# Altium footprint library ICL_modules_v1.PcbLib: 24 footprints (part 2 of 2)
Each footprint in its own frame and in the unit in brackets; x right, y up, seen from the top. Pads: shape width x height; smd on the part's side, far side on the other; paste and mask are expansions set on the pad; w line width, h text height; cw(c..) or ccw(c..) is an arc to the next point about the centre after c.
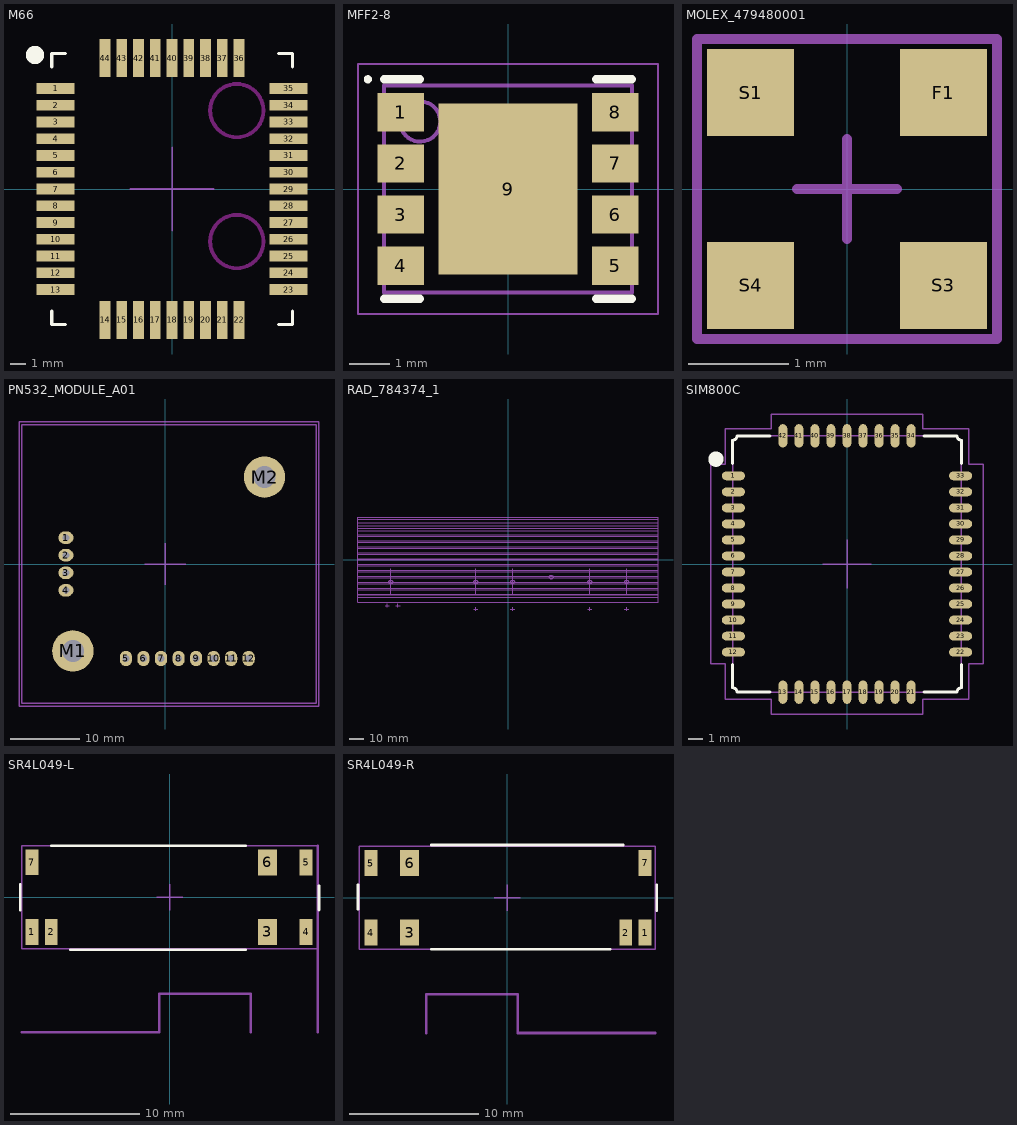
[diagram p1: the footprints below, top view; thin cyan lines are the x and y axes]

## M66 [mm]
pads (44):
  rect 2.5x0.7 smd mask+0.1: 1(-7.65,6.6) 2(-7.65,5.5) 3(-7.65,4.4) 4(-7.65,3.3) 5(-7.65,2.2) 6(-7.65,1.1) 7(-7.65,0) 8(-7.65,-1.1) 9(-7.65,-2.2) 10(-7.65,-3.3) 11(-7.65,-4.4) 12(-7.65,-5.5) 13(-7.65,-6.6) 23(7.65,-6.6) 24(7.65,-5.5) 25(7.65,-4.4) 26(7.65,-3.3) 27(7.65,-2.2) 28(7.65,-1.1) 29(7.65,0) 30(7.65,1.1) 31(7.65,2.2) 32(7.65,3.3) 33(7.65,4.4) 34(7.65,5.5) 35(7.65,6.6)
  rect 0.7x2.5 smd mask+0.1: 14(-4.4,-8.6) 15(-3.3,-8.6) 16(-2.2,-8.6) 17(-1.1,-8.6) 18(0,-8.6) 19(1.1,-8.6) 20(2.2,-8.6) 21(3.3,-8.6) 22(4.4,-8.6) 36(4.4,8.6) 37(3.3,8.6) 38(2.2,8.6) 39(1.1,8.6) 40(0,8.6) 41(-1.1,8.6) 42(-2.2,8.6) 43(-3.3,8.6) 44(-4.4,8.6)
Top Layer keep-out:
  circle w0.254: c4.25,5.15 r1.75
  circle w0.254: c4.25,-3.45 r1.75
Top Overlay:
  circle w0.6: c-9,8.8 r0.3
  lines w0.2: -7.9,-8 -7.9,-8.9 -7,-8.9 ; -7.9,8 -7.9,8.9 -7,8.9 ; 7,-8.9 7.9,-8.9 7.9,-8 ; 7,8.9 7.9,8.9 7.9,8
Top M15-16_SORG:
  lines w0.1: -2.75,0 0,0 ; 0,-2.75 0,0 ; 0,2.75 0,0 ; 2.75,0 0,0
3D body "m66_3d_v2.STEP": height 2.3, standoff 0, extent -7.9,-8.85 7.9,8.85

## MFF2-8 [mm] "PSON, 8-Leads, Body 5,08x6,08mm, Pitch 1,27mm, Thermal Pad 4,25x3,45mm, IPC Low Density"
height 0.9
pads (9):
  rect 1.15x0.95 smd: 1(-2.665,1.905) 2(-2.665,0.635) 3(-2.665,-0.635) 4(-2.665,-1.905) 5(2.665,-1.905) 6(2.665,-0.635) 7(2.665,0.635) 8(2.665,1.905)
  rect 3.45x4.25 smd paste-1.725: 9(0,0)
Top Overlay:
  circle w0.1: c-3.48,2.725 r0.05
  lines w0.2: -3.08,-2.725 -2.19,-2.725 ; -3.08,2.725 -2.19,2.725 ; 2.19,-2.725 3.08,-2.725 ; 2.19,2.725 3.08,2.725
Top Paste:
  rectangle: 0.675,-2.03 1.625,-0.81
  rectangle: 0.675,-0.61 1.625,0.61
  rectangle: 0.675,0.81 1.625,2.03
  rectangle: -0.475,-2.03 0.475,-0.81
  rectangle: -0.475,-0.61 0.475,0.61
  rectangle: -0.475,0.81 0.475,2.03
  rectangle: -1.625,-2.03 -0.675,-0.81
  rectangle: -1.625,-0.61 -0.675,0.61
  rectangle: -1.625,0.81 -0.675,2.03
Top M13-14_SDES:
  circle w0.1: c-2.18,1.675 r0.5
  lines w0.1: -3.08,-2.575 3.08,-2.575 3.08,2.575 -3.08,2.575 -3.08,-2.575
Top M15-16_SORG:
  lines w0.05: -3.725,-3.1 3.725,-3.1 3.725,3.1 -3.725,3.1 -3.725,-3.1
  lines w0.1: -0.5,0 0.5,0 ; 0,-0.5 0,0.5
3D body "MFF2-8.step": height 0.9, standoff 0, extent -3.081,-2.575 3.081,2.575

## MOLEX_479480001 [mm] "Antena 2,54GHz MID"
pads (4):
  rect 0.87x0.87 smd mask+0.1: F1(0.965,0.965) S1(-0.965,0.965) S3(0.965,-0.965) S4(-0.965,-0.965)
Top M15-16_SORG:
  lines w0.1: -0.5,0 0.5,0 ; 0,-0.5 0,0.5 ; -1.5,-1.5 1.5,-1.5 1.5,1.5 -1.5,1.5 -1.5,-1.5
3D body "479480001.stp": height 4, standoff 0, extent -1.57,-1.57 1.57,1.57

## PN532_MODULE_A01 [mm] "NFC module"
pads (14):
  oval 2.2x1.8 hole 1: 1(-14.4,3.81) 2(-14.4,1.27) 3(-14.4,-1.27) 4(-14.4,-3.81)
  oval 1.8x2.2 hole 1: 5(-5.69,-13.7) 6(-3.15,-13.7) 7(-0.61,-13.7) 8(1.93,-13.7) 9(4.47,-13.7) 10(7.01,-13.7) 11(9.55,-13.7) 12(12.091,-13.7)
  round 6 hole 3.2: M1(-13.4,-12.6) M2(14.4,12.6)
Top M15-16_SORG:
  lines w0.2: -3,0 0,0 ; 0,-3 0,0 ; 0,3 0,0 ; 3,0 0,0 ; -21.2,-20.6 -21.2,20.6 22.3,20.6 22.3,-20.6 -21.2,-20.6
Top M17-18_TDES:
  text "'.Designator'" at -10.83,-0.533 h2
Top M19-20_TMOT:
  lines w0.2: -20.8,-20.2 21.9,-20.2 21.9,20.2 -20.8,20.2 -20.8,-20.2
3D body "PN532_NFC_Assembly.STEP": height 11.6, standoff 0.55, extent -20.8,-20.2 21.9,20.2

## RAD_784374_1 [mm]
Top M19-20_TMOT:
  drawing of 656 lines, arcs and shapes, not listed
3D body "784374swp001.stp": height 20, standoff -0.02, extent -105,-29.75 105,29.75

## SIM800C [mm]
pads (42):
  oval 1.6x0.6 smd mask+0.1: 1(-7.8,6.05) 2(-7.8,4.95) 3(-7.8,3.85) 4(-7.8,2.75) 5(-7.8,1.65) 6(-7.8,0.55) 7(-7.8,-0.55) 8(-7.8,-1.65) 9(-7.8,-2.75) 10(-7.8,-3.85) 11(-7.8,-4.95) 12(-7.8,-6.05) 22(7.8,-6.05) 23(7.8,-4.95) 24(7.8,-3.85) 25(7.8,-2.75) 26(7.8,-1.65) 27(7.8,-0.55) 28(7.8,0.55) 29(7.8,1.65) 30(7.8,2.75) 31(7.8,3.85) 32(7.8,4.95) 33(7.8,6.05)
  oval 0.6x1.6 smd mask+0.1: 13(-4.4,-8.8) 14(-3.3,-8.8) 15(-2.2,-8.8) 16(-1.1,-8.8) 17(0,-8.8) 18(1.1,-8.8) 19(2.2,-8.8) 20(3.3,-8.8) 21(4.4,-8.8) 34(4.4,8.8) 35(3.3,8.8) 36(2.2,8.8) 37(1.1,8.8) 38(0,8.8) 39(-1.1,8.8) 40(-2.2,8.8) 41(-3.3,8.8) 42(-4.4,8.8)
Top Overlay:
  circle w0.6: c-9,7.2 r0.224
  lines w0.2: -7.85,-6.9 -7.85,-8.5 cw(c-7.85,-8.8) -7.55,-8.8 -5.3,-8.8 ; -7.85,6.9 -7.85,8.5 ccw(c-7.85,8.8) -7.55,8.8 -5.3,8.8 ; 5.3,-8.8 7.55,-8.8 cw(c7.85,-8.8) 7.85,-8.5 7.85,-6.9 ; 5.3,8.8 7.55,8.8 ccw(c7.85,8.8) 7.85,8.5 7.85,6.9
Top M15-16_SORG:
  lines w0.1: -1.65,0 0,0 ; 0,-1.65 0,0 ; 0,1.65 0,0 ; 1.65,0 0,0 ; -9.35,-6.85 -8.35,-6.85 -8.35,-9.3 -5.2,-9.3 -5.2,-10.3 5.2,-10.3 5.2,-9.3 8.35,-9.3 8.35,-6.85 9.35,-6.85 9.35,6.85 8.35,6.85 8.35,9.3 5.2,9.3 5.2,10.3 -5.2,10.3 -5.2,9.3 -8.35,9.3 -8.35,6.85 -9.35,6.85 -9.35,-6.85 ; -7.85,-8.5 cw(c-7.85,-8.8) -7.55,-8.8 7.55,-8.8 cw(c7.85,-8.8) 7.85,-8.5 7.85,8.5 cw(c7.85,8.8) 7.55,8.8 -7.55,8.8 cw(c-7.85,8.8) -7.85,8.5 -7.85,-8.5
3D body "SIM800C-1.STEP": height 2.35, standoff 0.01, extent -7.9,-8.8 7.8,8.8

## SR4L049-L [mm]
pads (7):
  rect 1x2 smd: 1(-10.7,-2.7) 2(-9.2,-2.7) 4(10.6,-2.7) 5(10.6,2.7) 7(-10.7,2.71)
  rect 1.5x2 smd: 3(7.6,-2.7) 6(7.6,2.7)
Top Overlay:
  lines w0.2: -11.6,-1 -11.6,1 ; -9.2,4 5.9,4 ; -7.7,-4.1 5.9,-4.1 ; 11.6,-1 11.6,0.9
Top M15-16_SORG:
  lines w0.1: -1,0 0,0 ; 0,-1 0,0 ; 0,1 0,0 ; 1,0 0,0 ; -11.5,-4 11.5,-4 11.5,4 -11.5,4 -11.5,-4
  lines w0.2: -11.5,-10.5 -0.8,-10.5 -0.8,-7.5 6.3,-7.5 6.3,-10.5 ; 11.5,-10.5 11.5,4
3D body "SR4L049-L.STEP": height 3.31, standoff 0.02, extent -11.551,-4.009 11.449,3.991

## SR4L049-R [mm]
pads (7):
  rect 1x2 smd: 1(10.7,-2.7) 2(9.2,-2.7) 4(-10.6,-2.7) 5(-10.6,2.7) 7(10.7,2.71)
  rect 1.5x2 smd: 3(-7.6,-2.7) 6(-7.6,2.7)
Top Overlay:
  lines w0.2: -11.6,-0.9 -11.6,1 ; -5.9,-4 8,-4 ; -5.9,4.1 9,4.1 ; 11.6,-1 11.6,1
Top M15-16_SORG:
  lines w0.1: -1,0 0,0 ; 0,-1 0,0 ; 0,1 0,0 ; 1,0 0,0 ; -11.5,-4 -11.5,4 11.5,4 11.5,-4 -11.5,-4
  lines w0.2: -6.3,-10.5 -6.3,-7.5 0.8,-7.5 0.8,-10.5 11.5,-10.5
3D body "SR4L049-R.STEP": height 3.29, standoff 0, extent -11.5,-4 11.5,4